# Altium footprint library texas.PCBLIB: 124 footprints (part 10 of 12)
Each footprint in its own frame and in the unit in brackets; x right, y up, seen from the top. Pads: shape width x height; smd on the part's side, far side on the other; paste and mask are expansions set on the pad; w line width, h text height; cw(c..) or ccw(c..) is an arc to the next point about the centre after c.
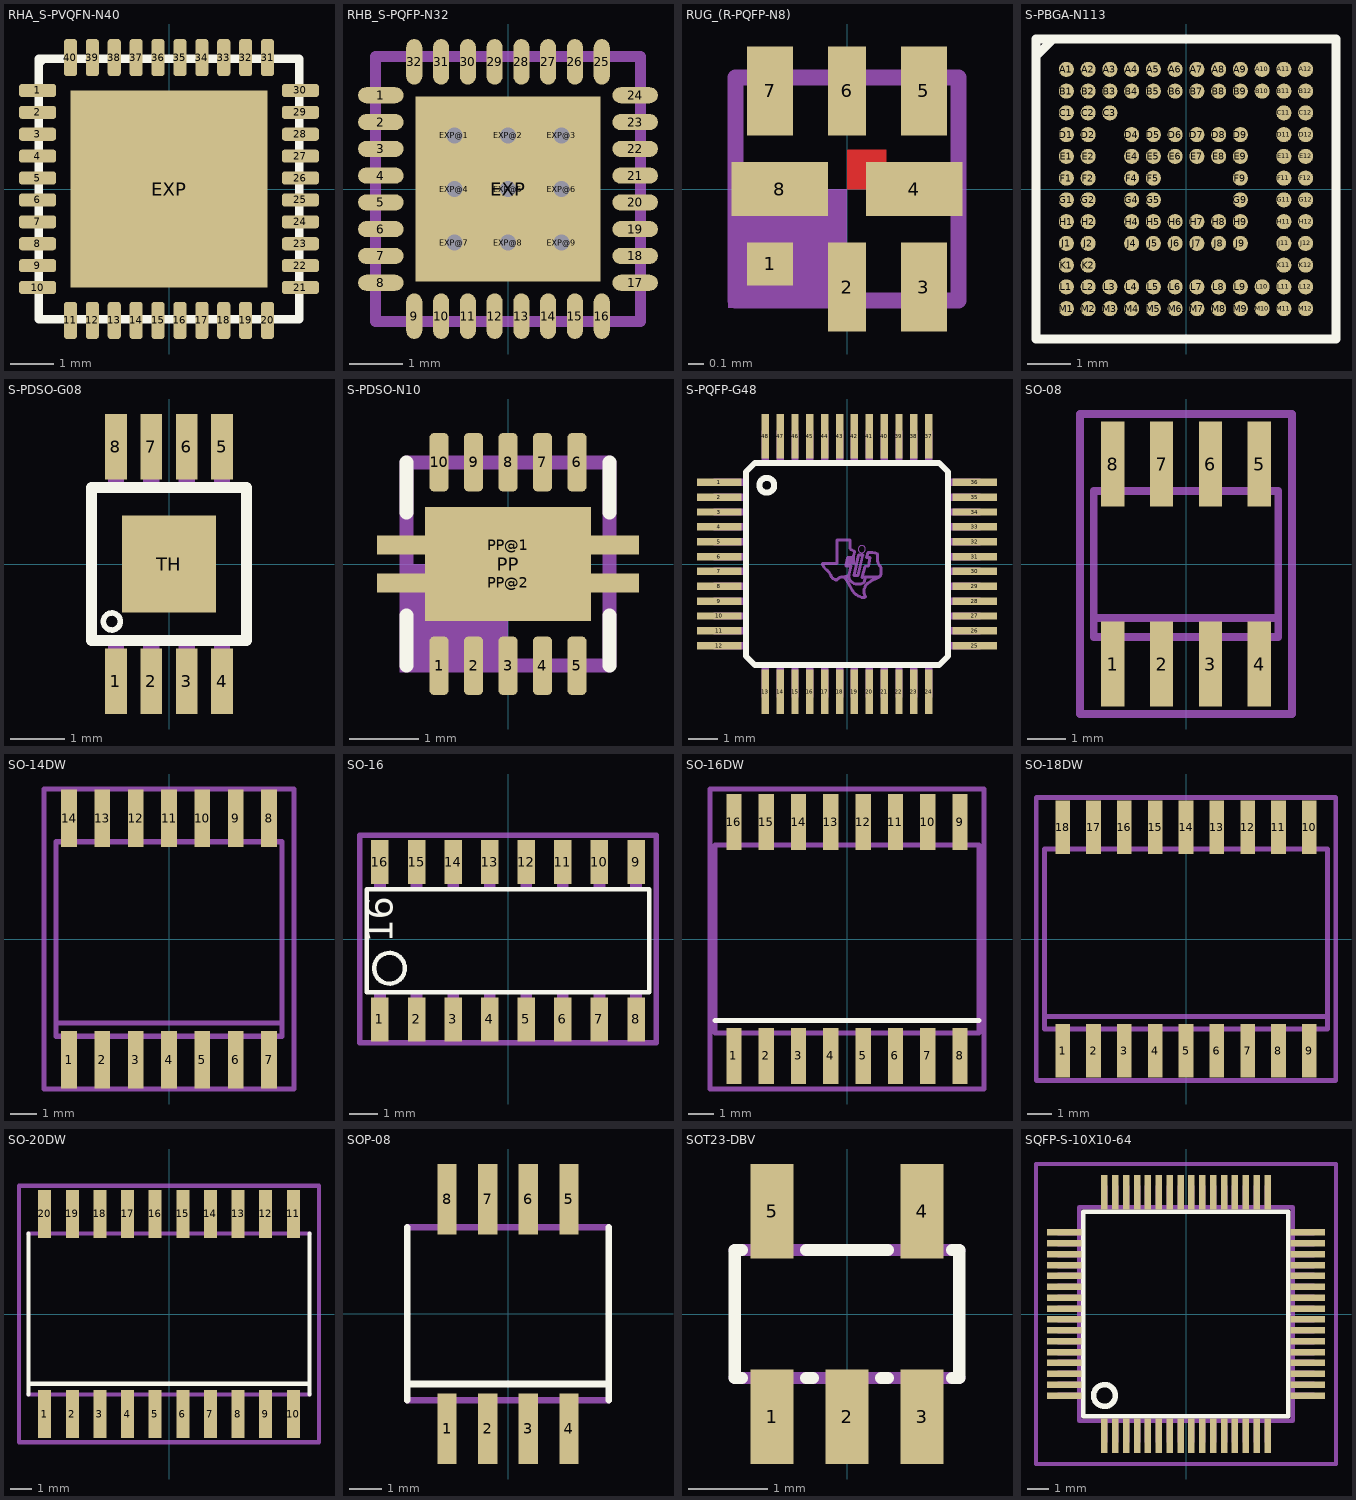
[diagram p9: the footprints below, top view; thin cyan lines are the x and y axes]

## RHA_S-PVQFN-N40 [mm]
pads (41):
  rrect50% 0.85x0.3 smd: 1(-3,2.25) 2(-3,1.75) 3(-3,1.25) 4(-3,0.75) 5(-3,0.25) 6(-3,-0.25) 7(-3,-0.75) 8(-3,-1.25) 9(-3,-1.75) 10(-3,-2.25) 21(3,-2.25) 22(3,-1.75) 23(3,-1.25) 24(3,-0.75) 25(3,-0.25) 26(3,0.25) 27(3,0.75) 28(3,1.25) 29(3,1.75) 30(3,2.25)
  rrect50% 0.3x0.85 smd: 11(-2.25,-3) 12(-1.75,-3) 13(-1.25,-3) 14(-0.75,-3) 15(-0.25,-3) 16(0.25,-3) 17(0.75,-3) 18(1.25,-3) 19(1.75,-3) 20(2.25,-3) 31(2.25,3) 32(1.75,3) 33(1.25,3) 34(0.75,3) 35(0.25,3) 36(-0.25,3) 37(-0.75,3) 38(-1.25,3) 39(-1.75,3) 40(-2.25,3)
  rect 4.5x4.5 smd: EXP(0,0)
Top Overlay:
  lines w0.203: -2.973,2.875 -2.875,2.973 ; -2.973,-2.973 2.973,-2.973 2.973,2.973 -2.973,2.973 -2.973,-2.973
Top Paste:
  circle w0: c-2.725,2.25 r0.125
  circle w0: c-2.725,1.75 r0.125
  circle w0: c-2.725,1.25 r0.125
  circle w0: c-2.725,0.75 r0.125
  circle w0: c-2.725,0.25 r0.125
  circle w0: c-2.725,-0.25 r0.125
  circle w0: c-2.725,-0.75 r0.125
  circle w0: c-2.725,-1.25 r0.125
  circle w0: c-2.725,-1.75 r0.125
  circle w0: c-2.725,-2.25 r0.125
  circle w0: c-2.25,-2.725 r0.125
  circle w0: c-1.75,-2.725 r0.125
  circle w0: c-1.25,-2.725 r0.125
  circle w0: c-0.75,-2.725 r0.125
  circle w0: c-0.25,-2.725 r0.125
  circle w0: c0.25,-2.725 r0.125
  circle w0: c0.75,-2.725 r0.125
  circle w0: c1.25,-2.725 r0.125
  circle w0: c1.75,-2.725 r0.125
  circle w0: c2.25,-2.725 r0.125
  circle w0: c2.725,-2.25 r0.125
  circle w0: c2.725,-1.75 r0.125
  circle w0: c2.725,-1.25 r0.125
  circle w0: c2.725,-0.75 r0.125
  circle w0: c2.725,-0.25 r0.125
  circle w0: c2.725,0.25 r0.125
  circle w0: c2.725,0.75 r0.125
  circle w0: c2.725,1.25 r0.125
  circle w0: c2.725,1.75 r0.125
  circle w0: c2.725,2.25 r0.125
  circle w0: c2.25,2.725 r0.125
  circle w0: c1.75,2.725 r0.125
  circle w0: c1.25,2.725 r0.125
  circle w0: c0.75,2.725 r0.125
  circle w0: c0.25,2.725 r0.125
  circle w0: c-0.25,2.725 r0.125
  circle w0: c-0.75,2.725 r0.125
  circle w0: c-1.25,2.725 r0.125
  circle w0: c-1.75,2.725 r0.125
  circle w0: c-2.25,2.725 r0.125
  rectangle: -3.375,2.125 -2.725,2.375
  rectangle: -3.375,1.625 -2.725,1.875
  rectangle: -3.375,1.125 -2.725,1.375
  rectangle: -3.375,0.625 -2.725,0.875
  rectangle: -3.375,0.125 -2.725,0.375
  rectangle: -3.375,-0.375 -2.725,-0.125
  rectangle: -3.375,-0.875 -2.725,-0.625
  rectangle: -3.375,-1.375 -2.725,-1.125
  rectangle: -3.375,-1.875 -2.725,-1.625
  rectangle: -3.375,-2.375 -2.725,-2.125
  region: -2.125,-3.375 -2.125,-2.725 -2.375,-2.725 -2.375,-3.375
  region: -1.625,-3.375 -1.625,-2.725 -1.875,-2.725 -1.875,-3.375
  region: -1.125,-3.375 -1.125,-2.725 -1.375,-2.725 -1.375,-3.375
  region: -0.625,-3.375 -0.625,-2.725 -0.875,-2.725 -0.875,-3.375
  region: -0.125,-3.375 -0.125,-2.725 -0.375,-2.725 -0.375,-3.375
  region: 0.375,-3.375 0.375,-2.725 0.125,-2.725 0.125,-3.375
  region: 0.875,-3.375 0.875,-2.725 0.625,-2.725 0.625,-3.375
  region: 1.375,-3.375 1.375,-2.725 1.125,-2.725 1.125,-3.375
  region: 1.875,-3.375 1.875,-2.725 1.625,-2.725 1.625,-3.375
  region: 2.375,-3.375 2.375,-2.725 2.125,-2.725 2.125,-3.375
  region: 3.375,-2.125 2.725,-2.125 2.725,-2.375 3.375,-2.375
  region: 3.375,-1.625 2.725,-1.625 2.725,-1.875 3.375,-1.875
  region: 3.375,-1.125 2.725,-1.125 2.725,-1.375 3.375,-1.375
  region: 3.375,-0.625 2.725,-0.625 2.725,-0.875 3.375,-0.875
  region: 3.375,-0.125 2.725,-0.125 2.725,-0.375 3.375,-0.375
  region: 3.375,0.375 2.725,0.375 2.725,0.125 3.375,0.125
  region: 3.375,0.875 2.725,0.875 2.725,0.625 3.375,0.625
  region: 3.375,1.375 2.725,1.375 2.725,1.125 3.375,1.125
  region: 3.375,1.875 2.725,1.875 2.725,1.625 3.375,1.625
  region: 3.375,2.375 2.725,2.375 2.725,2.125 3.375,2.125
  region: 2.125,3.375 2.125,2.725 2.375,2.725 2.375,3.375
  region: 1.625,3.375 1.625,2.725 1.875,2.725 1.875,3.375
  region: 1.125,3.375 1.125,2.725 1.375,2.725 1.375,3.375
  region: 0.625,3.375 0.625,2.725 0.875,2.725 0.875,3.375
  region: 0.125,3.375 0.125,2.725 0.375,2.725 0.375,3.375
  region: -0.375,3.375 -0.375,2.725 -0.125,2.725 -0.125,3.375
  region: -0.875,3.375 -0.875,2.725 -0.625,2.725 -0.625,3.375
  region: -1.375,3.375 -1.375,2.725 -1.125,2.725 -1.125,3.375
  region: -1.875,3.375 -1.875,2.725 -1.625,2.725 -1.625,3.375
  region: -2.375,3.375 -2.375,2.725 -2.125,2.725 -2.125,3.375
  rectangle: -1.95,0.75 -0.75,1.95
  rectangle: -0.6,-0.6 0.6,0.6
  rectangle: -1.95,-0.6 -0.75,0.6
  rectangle: 0.75,-0.6 1.95,0.6
  rectangle: -0.6,0.75 0.6,1.95
  rectangle: 0.75,0.75 1.95,1.95
  rectangle: -1.95,-1.95 -0.75,-0.75
  rectangle: -0.6,-1.95 0.6,-0.75
  rectangle: 0.75,-1.95 1.95,-0.75
Top Solder:
  drawing of 41 lines, arcs and shapes, not listed
Mechanical 16:
  rectangle: -3.4,2.135 -3.075,2.365
  rectangle: -3.4,1.635 -3.075,1.865
  rectangle: -3.4,1.135 -3.075,1.365
  rectangle: -3.4,0.635 -3.075,0.865
  rectangle: -3.4,0.135 -3.075,0.365
  rectangle: -3.4,-0.365 -3.075,-0.135
  rectangle: -3.4,-0.865 -3.075,-0.635
  rectangle: -3.4,-1.365 -3.075,-1.135
  rectangle: -3.4,-1.865 -3.075,-1.635
  rectangle: -3.4,-2.365 -3.075,-2.135
  rectangle: -2.365,-3.4 -2.135,-3.075
  rectangle: -1.865,-3.4 -1.635,-3.075
  rectangle: -1.365,-3.4 -1.135,-3.075
  rectangle: -0.865,-3.4 -0.635,-3.075
  rectangle: -0.365,-3.4 -0.135,-3.075
  rectangle: 0.135,-3.4 0.365,-3.075
  rectangle: 0.635,-3.4 0.865,-3.075
  rectangle: 1.135,-3.4 1.365,-3.075
  rectangle: 1.635,-3.4 1.865,-3.075
  rectangle: 2.135,-3.4 2.365,-3.075
  rectangle: 3.075,-2.365 3.4,-2.135
  rectangle: 3.075,-1.865 3.4,-1.635
  rectangle: 3.075,-1.365 3.4,-1.135
  rectangle: 3.075,-0.865 3.4,-0.635
  rectangle: 3.075,-0.365 3.4,-0.135
  rectangle: 3.075,0.135 3.4,0.365
  rectangle: 3.075,0.635 3.4,0.865
  rectangle: 3.075,1.135 3.4,1.365
  rectangle: 3.075,1.635 3.4,1.865
  rectangle: 3.075,2.135 3.4,2.365
  rectangle: 2.135,3.075 2.365,3.4
  rectangle: 1.635,3.075 1.865,3.4
  rectangle: 1.135,3.075 1.365,3.4
  rectangle: 0.635,3.075 0.865,3.4
  rectangle: 0.135,3.075 0.365,3.4
  rectangle: -0.365,3.075 -0.135,3.4
  rectangle: -0.865,3.075 -0.635,3.4
  rectangle: -1.365,3.075 -1.135,3.4
  rectangle: -1.865,3.075 -1.635,3.4
  rectangle: -2.365,3.075 -2.135,3.4

## RHB_S-PQFP-N32 [mil]
pads (42):
  rrect100% 33.46x11.81 smd: 1(-93.5,68.9) 2(-93.5,49.21) 3(-93.5,29.53) 4(-93.5,9.84) 5(-93.5,-9.84) 6(-93.5,-29.53) 7(-93.5,-49.21) 8(-93.5,-68.9) 17(93.5,-68.9) 18(93.5,-49.21) 19(93.5,-29.53) 20(93.5,-9.84) 21(93.5,9.84) 22(93.5,29.53) 23(93.5,49.21) 24(93.5,68.9)
  rrect100% 11.81x33.46 smd: 9(-68.9,-93.5) 10(-49.21,-93.5) 11(-29.53,-93.5) 12(-9.84,-93.5) 13(9.84,-93.5) 14(29.53,-93.5) 15(49.21,-93.5) 16(68.9,-93.5) 25(68.9,93.5) 26(49.21,93.5) 27(29.53,93.5) 28(9.84,93.5) 29(-9.84,93.5) 30(-29.53,93.5) 31(-49.21,93.5) 32(-68.9,93.5)
  rect 135.83x135.83 smd: EXP(0,0)
  round 23.62 hole 11.81: EXP@1(-39.37,39.37) EXP@2(0,39.37) EXP@3(39.37,39.37) EXP@4(-39.37,0) EXP@5(0,0) EXP@6(39.37,0) EXP@7(-39.37,-39.37) EXP@8(0,-39.37) EXP@9(39.37,-39.37)
Top Paste:
  rectangle: -62.99,5.91 -5.91,62.99
  region: -5.91,-62.99 -5.91,-5.91 -62.99,-5.91 -62.99,-62.99
  region: 62.99,-5.91 5.91,-5.91 5.91,-62.99 62.99,-62.99
  region: 5.91,62.99 5.91,5.91 62.99,5.91 62.99,62.99
  lines w11.02: -104.33,-68.9 -82.68,-68.9 ; -104.33,-49.21 -82.68,-49.21 ; -104.33,-29.53 -82.68,-29.53 ; -104.33,-9.84 -82.68,-9.84 ; -104.33,9.84 -82.68,9.84 ; -104.33,29.53 -82.68,29.53 ; -104.33,49.21 -82.68,49.21 ; -104.33,68.9 -82.68,68.9 ; -68.9,-104.33 -68.9,-82.68 ; -68.9,82.68 -68.9,104.33 ; -49.21,-104.33 -49.21,-82.68 ; -49.21,82.68 -49.21,104.33 ; -29.53,-104.33 -29.53,-82.68 ; -29.53,82.68 -29.53,104.33 ; -9.84,-104.33 -9.84,-82.68 ; -9.84,82.68 -9.84,104.33 ; 9.84,-104.33 9.84,-82.68 ; 9.84,82.68 9.84,104.33 ; 29.53,-104.33 29.53,-82.68 ; 29.53,82.68 29.53,104.33 ; 49.21,-104.33 49.21,-82.68 ; 49.21,82.68 49.21,104.33 ; 68.9,-104.33 68.9,-82.68 ; 68.9,82.68 68.9,104.33 ; 82.68,-68.9 104.33,-68.9 ; 82.68,-49.21 104.33,-49.21 ; 82.68,-29.53 104.33,-29.53 ; 82.68,-9.84 104.33,-9.84 ; 82.68,9.84 104.33,9.84 ; 82.68,29.53 104.33,29.53 ; 82.68,49.21 104.33,49.21 ; 82.68,68.9 104.33,68.9
Top Solder:
  rectangle: -68.9,-68.9 68.9,68.9
  lines w13.78: -104.33,-68.9 -82.68,-68.9 ; -104.33,-49.21 -82.68,-49.21 ; -104.33,-29.53 -82.68,-29.53 ; -104.33,-9.84 -82.68,-9.84 ; -104.33,9.84 -82.68,9.84 ; -104.33,29.53 -82.68,29.53 ; -104.33,49.21 -82.68,49.21 ; -104.33,68.9 -82.68,68.9 ; -68.9,-104.33 -68.9,-82.68 ; -68.9,82.68 -68.9,104.33 ; -49.21,-104.33 -49.21,-82.68 ; -49.21,82.68 -49.21,104.33 ; -29.53,-104.33 -29.53,-82.68 ; -29.53,82.68 -29.53,104.33 ; -9.84,-104.33 -9.84,-82.68 ; -9.84,82.68 -9.84,104.33 ; 9.84,-104.33 9.84,-82.68 ; 9.84,82.68 9.84,104.33 ; 29.53,-104.33 29.53,-82.68 ; 29.53,82.68 29.53,104.33 ; 49.21,-104.33 49.21,-82.68 ; 49.21,82.68 49.21,104.33 ; 68.9,-104.33 68.9,-82.68 ; 68.9,82.68 68.9,104.33 ; 82.68,-68.9 104.33,-68.9 ; 82.68,-49.21 104.33,-49.21 ; 82.68,-29.53 104.33,-29.53 ; 82.68,-9.84 104.33,-9.84 ; 82.68,9.84 104.33,9.84 ; 82.68,29.53 104.33,29.53 ; 82.68,49.21 104.33,49.21 ; 82.68,68.9 104.33,68.9
Mechanical 16:
  lines w8: -97.38,-97.38 97.38,-97.38 97.38,97.38 -97.38,97.38 -97.38,-97.38

## RUG_(R-PQFP-N8) [mm]
pads (8):
  rect 0.3x0.28 smd: 1(-0.5,-0.487)
  rect 0.25x0.58 smd: 2(0,-0.638) 6(0,0.638)
  rect 0.3x0.58 smd: 3(0.5,-0.638) 5(0.5,0.638) 7(-0.5,0.638)
  rect 0.63x0.35 smd: 4(0.437,0) 8(-0.437,0)
Top Layer:
  region: 0,0 0.254,0 0.254,0.254 0,0.254
Top Paste:
  rectangle: -0.125,-0.913 0.125,-0.362
  rectangle: 0.375,-0.913 0.625,-0.362
  rectangle: 0.15,-0.15 0.725,0.15
  region: 0.125,0.913 -0.125,0.913 -0.125,0.362 0.125,0.362
  region: 0.625,0.913 0.375,0.913 0.375,0.362 0.625,0.362
  region: -0.375,0.913 -0.625,0.913 -0.625,0.362 -0.375,0.362
  region: -0.15,0.15 -0.725,0.15 -0.725,-0.15 -0.15,-0.15
  region: 0,0 0.254,0 0.254,0.254 0,0.254
Top Solder:
  rectangle: -0.7,-0.975 -0.3,-0.3
  rectangle: -0.175,-0.975 0.175,-0.3
  rectangle: 0.3,-0.975 0.688,-0.3
  rectangle: 0.075,-0.225 0.8,0.225
  region: 0.7,0.975 0.3,0.975 0.3,0.3 0.7,0.3
  region: 0.175,0.975 -0.175,0.975 -0.175,0.3 0.175,0.3
  region: -0.3,0.975 -0.7,0.975 -0.7,0.3 -0.3,0.3
  region: -0.075,0.225 -0.8,0.225 -0.8,-0.225 -0.075,-0.225
Mechanical 16:
  rectangle: -0.775,-0.775 0,0
  lines w0.102: -0.725,-0.725 0.725,-0.725 0.725,0.725 -0.725,0.725 -0.725,-0.725

## S-PBGA-N113 [mm]
pads (111):
  rrect100% 0.35x0.35 smd: A1(-2.75,2.75) A2(-2.25,2.75) A3(-1.75,2.75) A4(-1.25,2.75) A5(-0.75,2.75) A6(-0.25,2.75) A7(0.25,2.75) A8(0.75,2.75) A9(1.25,2.75) A10(1.75,2.75) A11(2.25,2.75) A12(2.75,2.75) B1(-2.75,2.25) B2(-2.25,2.25) B3(-1.75,2.25) B4(-1.25,2.25) B5(-0.75,2.25) B6(-0.25,2.25) B7(0.25,2.25) B8(0.75,2.25) B9(1.25,2.25) B10(1.75,2.25) B11(2.25,2.25) B12(2.75,2.25) C1(-2.75,1.75) C2(-2.25,1.75) C3(-1.75,1.75) C11(2.25,1.75) C12(2.75,1.75) D1(-2.75,1.25) D2(-2.25,1.25) D4(-1.25,1.25) D5(-0.75,1.25) D6(-0.25,1.25) D7(0.25,1.25) D8(0.75,1.25) D9(1.25,1.25) D11(2.25,1.25) D12(2.75,1.25) E1(-2.75,0.75) E2(-2.25,0.75) E4(-1.25,0.75) E5(-0.75,0.75) E6(-0.25,0.75) E7(0.25,0.75) E8(0.75,0.75) E9(1.25,0.75) E11(2.25,0.75) E12(2.75,0.75) F1(-2.75,0.25) F2(-2.25,0.25) F4(-1.25,0.25) F5(-0.75,0.25) F9(1.25,0.25) F11(2.25,0.25) F12(2.75,0.25) G1(-2.75,-0.25) G2(-2.25,-0.25) G4(-1.25,-0.25) G5(-0.75,-0.25) G9(1.25,-0.25) G11(2.25,-0.25) G12(2.75,-0.25) H1(-2.75,-0.75) H2(-2.25,-0.75) H4(-1.25,-0.75) H5(-0.75,-0.75) H6(-0.25,-0.75) H7(0.25,-0.75) H8(0.75,-0.75) H9(1.25,-0.75) H11(2.25,-0.75) H12(2.75,-0.75) J1(-2.75,-1.25) J2(-2.25,-1.25) J4(-1.25,-1.25) J5(-0.75,-1.25) J6(-0.25,-1.25) J7(0.25,-1.25) J8(0.75,-1.25) J9(1.25,-1.25) J11(2.25,-1.25) J12(2.75,-1.25) K1(-2.75,-1.75) K2(-2.25,-1.75) K11(2.25,-1.75) K12(2.75,-1.75) L1(-2.75,-2.25) L2(-2.25,-2.25) L3(-1.75,-2.25) L4(-1.25,-2.25) L5(-0.75,-2.25) L6(-0.25,-2.25) L7(0.25,-2.25) L8(0.75,-2.25) L9(1.25,-2.25) L10(1.75,-2.25) L11(2.25,-2.25) L12(2.75,-2.25) M1(-2.75,-2.75) M2(-2.25,-2.75) M3(-1.75,-2.75) M4(-1.25,-2.75) M5(-0.75,-2.75) M6(-0.25,-2.75) M7(0.25,-2.75) M8(0.75,-2.75) M9(1.25,-2.75) M10(1.75,-2.75) M11(2.25,-2.75) M12(2.75,-2.75)
Top Overlay:
  lines w0.203: -3.448,3.05 -3.448,3.448 -3.05,3.448 ; -3.448,3.05 -3.448,-3.448 3.448,-3.448 3.448,3.448 -3.05,3.448 ; -3.448,3.05 -3.05,3.448
Top Solder:
  circle w0: c2.25,-2.75 r0.175
  circle w0: c1.75,-2.75 r0.175
  circle w0: c1.25,-2.75 r0.175
  circle w0: c0.75,-2.75 r0.175
  circle w0: c0.25,-2.75 r0.175
  circle w0: c-0.25,-2.75 r0.175
  circle w0: c-0.75,-2.75 r0.175
  circle w0: c-1.25,-2.75 r0.175
  circle w0: c-1.75,-2.75 r0.175
  circle w0: c-2.25,-2.75 r0.175
  circle w0: c2.75,-2.25 r0.175
  circle w0: c1.75,-2.25 r0.175
  circle w0: c1.25,-2.25 r0.175
  circle w0: c0.75,-2.25 r0.175
  circle w0: c0.25,-2.25 r0.175
  circle w0: c-0.25,-2.25 r0.175
  circle w0: c-0.75,-2.25 r0.175
  circle w0: c-1.25,-2.25 r0.175
  circle w0: c-1.75,-2.25 r0.175
  circle w0: c-2.75,-2.25 r0.175
  circle w0: c2.75,-1.75 r0.175
  circle w0: c2.25,-1.75 r0.175
  circle w0: c-2.25,-1.75 r0.175
  circle w0: c-2.75,-1.75 r0.175
  circle w0: c2.75,-1.25 r0.175
  circle w0: c2.25,-1.25 r0.175
  circle w0: c0.75,-1.25 r0.175
  circle w0: c0.25,-1.25 r0.175
  circle w0: c-0.25,-1.25 r0.175
  circle w0: c-0.75,-1.25 r0.175
  circle w0: c-2.25,-1.25 r0.175
  circle w0: c-2.75,-1.25 r0.175
  circle w0: c2.75,-0.75 r0.175
  circle w0: c2.25,-0.75 r0.175
  circle w0: c1.25,-0.75 r0.175
  circle w0: c0.25,-0.75 r0.175
  circle w0: c-0.25,-0.75 r0.175
  circle w0: c-0.75,-0.75 r0.175
  circle w0: c-1.25,-0.75 r0.175
  circle w0: c-2.25,-0.75 r0.175
  circle w0: c-2.75,-0.75 r0.175
  circle w0: c2.75,-0.25 r0.175
  circle w0: c2.25,-0.25 r0.175
  circle w0: c1.25,-0.25 r0.175
  circle w0: c-0.75,-0.25 r0.175
  circle w0: c-1.25,-0.25 r0.175
  circle w0: c-2.25,-0.25 r0.175
  circle w0: c-2.75,-0.25 r0.175
  circle w0: c2.75,0.25 r0.175
  circle w0: c2.25,0.25 r0.175
  circle w0: c1.25,0.25 r0.175
  circle w0: c-0.75,0.25 r0.175
  circle w0: c-1.25,0.25 r0.175
  circle w0: c-2.25,0.25 r0.175
  circle w0: c-2.75,0.25 r0.175
  circle w0: c2.75,0.75 r0.175
  circle w0: c2.25,0.75 r0.175
  circle w0: c1.25,0.75 r0.175
  circle w0: c0.75,0.75 r0.175
  circle w0: c0.25,0.75 r0.175
  circle w0: c-0.25,0.75 r0.175
  circle w0: c-0.75,0.75 r0.175
  circle w0: c-1.25,0.75 r0.175
  circle w0: c-2.25,0.75 r0.175
  circle w0: c-2.75,0.75 r0.175
  circle w0: c2.75,1.25 r0.175
  circle w0: c2.25,1.25 r0.175
  circle w0: c0.75,1.25 r0.175
  circle w0: c0.25,1.25 r0.175
  circle w0: c-0.25,1.25 r0.175
  circle w0: c-0.75,1.25 r0.175
  circle w0: c-2.25,1.25 r0.175
  circle w0: c-2.75,1.25 r0.175
  circle w0: c2.75,1.75 r0.175
  circle w0: c2.25,1.75 r0.175
  circle w0: c-1.75,1.75 r0.175
  circle w0: c-2.25,1.75 r0.175
  circle w0: c-2.75,1.75 r0.175
  circle w0: c2.75,2.25 r0.175
  circle w0: c1.75,2.25 r0.175
  circle w0: c1.25,2.25 r0.175
  circle w0: c0.75,2.25 r0.175
  circle w0: c0.25,2.25 r0.175
  circle w0: c-0.25,2.25 r0.175
  circle w0: c-0.75,2.25 r0.175
  circle w0: c-1.25,2.25 r0.175
  circle w0: c-1.75,2.25 r0.175
  circle w0: c-2.25,2.25 r0.175
  circle w0: c-2.75,2.25 r0.175
  circle w0: c2.25,2.75 r0.175
  circle w0: c1.75,2.75 r0.175
  circle w0: c1.25,2.75 r0.175
  circle w0: c0.75,2.75 r0.175
  circle w0: c0.25,2.75 r0.175
  circle w0: c-0.25,2.75 r0.175
  circle w0: c-0.75,2.75 r0.175
  circle w0: c-1.25,2.75 r0.175
  circle w0: c-1.75,2.75 r0.175
  circle w0: c-2.25,2.75 r0.175
  circle w0: c-2.75,2.75 r0.175
  circle w0: c-2.75,-2.75 r0.175
  circle w0: c-2.25,-2.25 r0.175
  circle w0: c2.75,-2.75 r0.175
  circle w0: c2.25,-2.25 r0.175
  circle w0: c2.25,2.25 r0.175
  circle w0: c2.75,2.75 r0.175
  circle w0: c-1.25,1.25 r0.175
  circle w0: c1.25,1.25 r0.175
  circle w0: c-1.25,-1.25 r0.175
  circle w0: c1.25,-1.25 r0.175
  circle w0: c0.75,-0.75 r0.175

## S-PDSO-G08 [mm]
pads (9):
  rect 0.4x1.2 smd: 1(-0.975,-2.157) 2(-0.325,-2.157) 3(0.325,-2.157) 4(0.975,-2.157) 5(0.975,2.157) 6(0.325,2.157) 7(-0.325,2.157) 8(-0.975,2.157)
  rect 1.73x1.78 smd: TH(0,0)
Top Overlay:
  circle w0.102: c-1.05,-1.057 r0.157
  lines w0.203: -1.425,-1.407 1.425,-1.407 1.425,1.407 -1.425,1.407 -1.425,-1.407
Top Paste:
  rectangle: -0.825,-0.85 0.825,0.85
Top Solder:
  rectangle: -0.85,-0.875 0.85,0.875
Mechanical 16:
  rectangle: -1.125,-2.5 -0.825,-1.487
  rectangle: -0.475,-2.5 -0.175,-1.487
  rectangle: 0.175,-2.5 0.475,-1.487
  rectangle: 0.825,-2.5 1.125,-1.487
  region: 1.125,2.5 0.825,2.5 0.825,1.487 1.125,1.487
  region: 0.475,2.5 0.175,2.5 0.175,1.487 0.475,1.487
  region: -0.175,2.5 -0.475,2.5 -0.475,1.487 -0.175,1.487
  region: -0.825,2.5 -1.125,2.5 -1.125,1.487 -0.825,1.487

## S-PDSO-N10 [mm]
pads (13):
  rrect50% 0.28x0.85 smd: 1(-1,-1.475) 2(-0.5,-1.475) 3(0,-1.475) 4(0.5,-1.475) 5(1,-1.475) 6(1,1.475) 7(0.5,1.475) 8(0,1.475) 9(-0.5,1.475) 10(-1,1.475)
  rect 2.4x1.65 smd: PP(0,0)
  rect 3.8x0.28 smd: PP@1(0,0.275) PP@2(0,-0.275)
Top Overlay:
  lines w0.203: -1.475,-1.475 -1.475,-0.748 ; -1.475,0.748 -1.475,1.475 ; 1.475,-1.475 1.475,-0.748 ; 1.475,0.748 1.475,1.475
Top Paste:
  circle w0: c-1,-1.165 r0.115
  circle w0: c-0.5,-1.165 r0.115
  circle w0: c0,-1.165 r0.115
  circle w0: c0.5,-1.165 r0.115
  circle w0: c1,-1.165 r0.115
  circle w0: c1,1.165 r0.115
  circle w0: c0.5,1.165 r0.115
  circle w0: c0,1.165 r0.115
  circle w0: c-0.5,1.165 r0.115
  circle w0: c-1,1.165 r0.115
  rectangle: -1.9,0.15 -1.325,0.4
  rectangle: -1.9,-0.4 -1.325,-0.15
  rectangle: -1.175,0.15 -0.15,0.8
  rectangle: -1.175,-0.8 -0.15,-0.15
  region: 1.175,-0.15 0.15,-0.15 0.15,-0.8 1.175,-0.8
  region: 1.175,0.8 0.15,0.8 0.15,0.15 1.175,0.15
  region: -0.885,-1.85 -0.885,-1.165 -1.115,-1.165 -1.115,-1.85
  region: -0.385,-1.85 -0.385,-1.165 -0.615,-1.165 -0.615,-1.85
  region: 0.115,-1.85 0.115,-1.165 -0.115,-1.165 -0.115,-1.85
  region: 0.615,-1.85 0.615,-1.165 0.385,-1.165 0.385,-1.85
  region: 1.115,-1.85 1.115,-1.165 0.885,-1.165 0.885,-1.85
  region: 0.885,1.85 0.885,1.165 1.115,1.165 1.115,1.85
  region: 0.385,1.85 0.385,1.165 0.615,1.165 0.615,1.85
  region: -0.115,1.85 -0.115,1.165 0.115,1.165 0.115,1.85
  region: -0.615,1.85 -0.615,1.165 -0.385,1.165 -0.385,1.85
  region: -1.115,1.85 -1.115,1.165 -0.885,1.165 -0.885,1.85
  region: 1.9,-0.15 1.325,-0.15 1.325,-0.4 1.9,-0.4
  region: 1.9,0.4 1.325,0.4 1.325,0.15 1.9,0.15
Top Solder:
  circle w0: c-1,-1.165 r0.175
  circle w0: c-0.5,-1.165 r0.175
  circle w0: c0,-1.165 r0.175
  circle w0: c0.5,-1.165 r0.175
  circle w0: c1,-1.165 r0.175
  circle w0: c1,1.165 r0.175
  circle w0: c0.5,1.165 r0.175
  circle w0: c0,1.165 r0.175
  circle w0: c-0.5,1.165 r0.175
  circle w0: c-1,1.165 r0.175
  rectangle: -1.925,0.125 -1.325,0.425
  rectangle: -1.925,-0.425 -1.325,-0.125
  rectangle: -1.225,-0.85 1.225,0.85
  rectangle: -1.175,-1.925 -0.825,-1.165
  rectangle: -0.675,-1.925 -0.325,-1.165
  rectangle: -0.175,-1.925 0.175,-1.165
  rectangle: 0.325,-1.925 0.675,-1.165
  rectangle: 0.825,-1.925 1.175,-1.165
  region: 1.175,1.925 0.825,1.925 0.825,1.165 1.175,1.165
  region: 0.675,1.925 0.325,1.925 0.325,1.165 0.675,1.165
  region: 0.175,1.925 -0.175,1.925 -0.175,1.165 0.175,1.165
  region: -0.325,1.925 -0.675,1.925 -0.675,1.165 -0.325,1.165
  region: -0.825,1.925 -1.175,1.925 -1.175,1.165 -0.825,1.165
  region: 1.925,-0.125 1.325,-0.125 1.325,-0.425 1.925,-0.425
  region: 1.925,0.425 1.325,0.425 1.325,0.125 1.925,0.125
Mechanical 16:
  rectangle: -1.575,-1.575 0,0
  lines w0.203: -1.475,-1.475 1.475,-1.475 1.475,1.475 -1.475,1.475 -1.475,-1.475

## S-PQFP-G48 [mm]
pads (48):
  rect 1.5x0.25 smd: 1(-4.3,2.75) 2(-4.3,2.25) 3(-4.3,1.75) 4(-4.3,1.25) 5(-4.3,0.75) 6(-4.3,0.25) 7(-4.3,-0.25) 8(-4.3,-0.75) 9(-4.3,-1.25) 10(-4.3,-1.75) 11(-4.3,-2.25) 12(-4.3,-2.75) 25(4.3,-2.75) 26(4.3,-2.25) 27(4.3,-1.75) 28(4.3,-1.25) 29(4.3,-0.75) 30(4.3,-0.25) 31(4.3,0.25) 32(4.3,0.75) 33(4.3,1.25) 34(4.3,1.75) 35(4.3,2.25) 36(4.3,2.75)
  rect 0.25x1.5 smd: 13(-2.75,-4.3) 14(-2.25,-4.3) 15(-1.75,-4.3) 16(-1.25,-4.3) 17(-0.75,-4.3) 18(-0.25,-4.3) 19(0.25,-4.3) 20(0.75,-4.3) 21(1.25,-4.3) 22(1.75,-4.3) 23(2.25,-4.3) 24(2.75,-4.3) 37(2.75,4.3) 38(2.25,4.3) 39(1.75,4.3) 40(1.25,4.3) 41(0.75,4.3) 42(0.25,4.3) 43(-0.25,4.3) 44(-0.75,4.3) 45(-1.25,4.3) 46(-1.75,4.3) 47(-2.25,4.3) 48(-2.75,4.3)
Top Overlay:
  circle w0.203: c-2.7,2.65 r0.25
  lines w0.203: -3.4,-3.1 -3.4,3.1 -3.1,3.4 3.1,3.4 3.4,3.1 3.4,-3.1 3.1,-3.4 -3.1,-3.4 -3.4,-3.1
Mechanical 16:
  drawing of 146 lines, arcs and shapes, not listed

## SO-08 [mm]
pads (8):
  rect 0.6x2.2 smd: 1(-1.905,-2.6) 2(-0.635,-2.6) 3(0.635,-2.6) 4(1.905,-2.6) 5(1.905,2.6) 6(0.635,2.6) 7(-0.635,2.6) 8(-1.905,2.6)
Mechanical 16:
  rectangle: -2.15,-3.1 -1.66,-2
  rectangle: -0.88,-3.1 -0.39,-2
  rectangle: 0.39,-3.1 0.88,-2
  rectangle: 1.66,-3.1 2.15,-2
  rectangle: 1.66,2 2.15,3.1
  rectangle: 0.39,2 0.88,3.1
  rectangle: -0.88,2 -0.39,3.1
  rectangle: -2.15,2 -1.66,3.1
  lines w0.203: -2.4,-1.4 -2.4,-1.9 2.4,-1.9 2.4,-1.4 ; -2.4,-1.4 -2.4,1.9 2.4,1.9 2.4,-1.4 ; -2.4,-1.4 2.4,-1.4
Mechanical 27:
  lines w0.2: -2.754,-3.9 2.754,-3.9 2.754,3.9 -2.754,3.9 -2.754,-3.9

## SO-14DW [mm]
pads (14):
  rect 0.6x2.2 smd: 1(-3.81,-4.6) 2(-2.54,-4.6) 3(-1.27,-4.6) 4(0,-4.6) 5(1.27,-4.6) 6(2.54,-4.6) 7(3.81,-4.6) 8(3.81,4.6) 9(2.54,4.6) 10(1.27,4.6) 11(0,4.6) 12(-1.27,4.6) 13(-2.54,4.6) 14(-3.81,4.6)
Mechanical 16:
  rectangle: -4.055,-5.32 -3.565,-3.8
  rectangle: -2.785,-5.32 -2.295,-3.8
  rectangle: -1.515,-5.32 -1.025,-3.8
  rectangle: -0.245,-5.32 0.245,-3.8
  rectangle: 1.025,-5.32 1.515,-3.8
  rectangle: 2.295,-5.32 2.785,-3.8
  rectangle: 3.565,-5.32 4.055,-3.8
  rectangle: 3.565,3.8 4.055,5.32
  rectangle: 2.295,3.8 2.785,5.32
  rectangle: 1.025,3.8 1.515,5.32
  rectangle: -0.245,3.8 0.245,5.32
  rectangle: -1.515,3.8 -1.025,5.32
  rectangle: -2.785,3.8 -2.295,5.32
  rectangle: -4.055,3.8 -3.565,5.32
  lines w0.203: -4.305,-3.2 -4.305,-3.7 4.305,-3.7 4.305,-3.2 ; -4.305,-3.2 -4.305,3.7 4.305,3.7 4.305,-3.2 ; -4.305,-3.2 4.305,-3.2
Mechanical 27:
  lines w0.2: -4.763,-5.715 -4.763,5.715 4.763,5.715 4.763,-5.715 -4.763,-5.715

## SO-16 [mil]
pads (16):
  rect 24x60 smd: 1(-175,-110) 2(-125,-110) 3(-75,-110) 4(-25,-110) 5(25,-110) 6(75,-110) 7(125,-110) 8(175,-110) 9(175,105) 10(125,105) 11(75,105) 12(25,105) 13(-25,105) 14(-75,105) 15(-125,105) 16(-175,105)
Top Overlay:
  circle w6: c-162,-40 r21
  lines w6: -193,-73 193,-73 193,68 -193,68 -193,-73
  text "16" at -145,-5 h62
Mechanical 16:
  rectangle: 167,69 183,109
  rectangle: 117,69 133,109
  rectangle: 67,69 83,109
  rectangle: 17,69 33,109
  rectangle: -33,69 -17,109
  rectangle: -83,69 -67,109
  rectangle: -133,69 -117,109
  rectangle: -183,69 -167,109
  rectangle: -183,-114 -167,-74
  rectangle: -133,-114 -117,-74
  rectangle: -83,-114 -67,-74
  rectangle: -33,-114 -17,-74
  rectangle: 17,-114 33,-74
  rectangle: 67,-114 83,-74
  rectangle: 117,-114 133,-74
  rectangle: 167,-114 183,-74
Mechanical 27:
  lines w7.87: -202.52,-141.77 -202.52,141.77 202.52,141.77 202.52,-141.77 -202.52,-141.77

## SO-16DW [mm]
pads (16):
  rect 0.6x2.2 smd: 1(-4.445,-4.6) 2(-3.175,-4.6) 3(-1.905,-4.6) 4(-0.635,-4.6) 5(0.635,-4.6) 6(1.905,-4.6) 7(3.175,-4.6) 8(4.445,-4.6) 9(4.445,4.6) 10(3.175,4.6) 11(1.905,4.6) 12(0.635,4.6) 13(-0.635,4.6) 14(-1.905,4.6) 15(-3.175,4.6) 16(-4.445,4.6)
Top Overlay:
  lines w0.203: -5.19,-3.2 5.19,-3.2
Mechanical 16:
  rectangle: -4.69,-5.32 -4.2,-3.8
  rectangle: -3.42,-5.32 -2.93,-3.8
  rectangle: -2.15,-5.32 -1.66,-3.8
  rectangle: -0.88,-5.32 -0.39,-3.8
  rectangle: 0.39,-5.32 0.88,-3.8
  rectangle: 1.66,-5.32 2.15,-3.8
  rectangle: 2.93,-5.32 3.42,-3.8
  rectangle: 4.2,-5.32 4.69,-3.8
  rectangle: 4.2,3.8 4.69,5.32
  rectangle: 2.93,3.8 3.42,5.32
  rectangle: 1.66,3.8 2.15,5.32
  rectangle: 0.39,3.8 0.88,5.32
  rectangle: -0.88,3.8 -0.39,5.32
  rectangle: -2.15,3.8 -1.66,5.32
  rectangle: -3.42,3.8 -2.93,5.32
  rectangle: -4.69,3.8 -4.2,5.32
  lines w0.203: -5.19,-3.7 5.19,-3.7 5.19,3.7 -5.19,3.7 -5.19,-3.7
Mechanical 27:
  lines w0.2: -5.395,-5.9 5.395,-5.9 5.395,5.9 -5.395,5.9 -5.395,-5.9

## SO-18DW [mm]
pads (18):
  rect 0.6x2.2 smd: 1(-5.08,-4.6) 2(-3.81,-4.6) 3(-2.54,-4.6) 4(-1.27,-4.6) 5(0,-4.6) 6(1.27,-4.6) 7(2.54,-4.6) 8(3.81,-4.6) 9(5.08,-4.6) 10(5.08,4.6) 11(3.81,4.6) 12(2.54,4.6) 13(1.27,4.6) 14(0,4.6) 15(-1.27,4.6) 16(-2.54,4.6) 17(-3.81,4.6) 18(-5.08,4.6)
Mechanical 16:
  rectangle: -5.325,-5.32 -4.835,-3.8
  rectangle: -4.055,-5.32 -3.565,-3.8
  rectangle: -2.785,-5.32 -2.295,-3.8
  rectangle: -1.515,-5.32 -1.025,-3.8
  rectangle: -0.245,-5.32 0.245,-3.8
  rectangle: 1.025,-5.32 1.515,-3.8
  rectangle: 2.295,-5.32 2.785,-3.8
  rectangle: 3.565,-5.32 4.055,-3.8
  rectangle: 4.835,-5.32 5.325,-3.8
  rectangle: 4.835,3.8 5.325,5.32
  rectangle: 3.565,3.8 4.055,5.32
  rectangle: 2.295,3.8 2.785,5.32
  rectangle: 1.025,3.8 1.515,5.32
  rectangle: -0.245,3.8 0.245,5.32
  rectangle: -1.515,3.8 -1.025,5.32
  rectangle: -2.785,3.8 -2.295,5.32
  rectangle: -4.055,3.8 -3.565,5.32
  rectangle: -5.325,3.8 -4.835,5.32
  lines w0.203: -5.825,-3.2 -5.825,-3.7 5.825,-3.7 5.825,-3.2 ; -5.825,-3.2 -5.825,3.7 5.825,3.7 5.825,-3.2 ; -5.825,-3.2 5.825,-3.2
Mechanical 27:
  lines w0.2: -6.172,-5.829 -6.172,5.829 6.172,5.829 6.172,-5.829 -6.172,-5.829

## SO-20DW [mm]
pads (20):
  rect 0.6x2.2 smd: 1(-5.715,-4.6) 2(-4.445,-4.6) 3(-3.175,-4.6) 4(-1.905,-4.6) 5(-0.635,-4.6) 6(0.635,-4.6) 7(1.905,-4.6) 8(3.175,-4.6) 9(4.445,-4.6) 10(5.715,-4.6) 11(5.715,4.6) 12(4.445,4.6) 13(3.175,4.6) 14(1.905,4.6) 15(0.635,4.6) 16(-0.635,4.6) 17(-1.905,4.6) 18(-3.175,4.6) 19(-4.445,4.6) 20(-5.715,4.6)
Top Overlay:
  lines w0.203: -6.46,-3.7 -6.46,-3.2 ; -6.46,3.7 -6.46,-3.2 ; 6.46,-3.7 6.46,3.7 ; 6.46,-3.2 -6.46,-3.2
Mechanical 16:
  rectangle: -5.96,-5.32 -5.47,-3.8
  rectangle: -4.69,-5.32 -4.2,-3.8
  rectangle: -3.42,-5.32 -2.93,-3.8
  rectangle: -2.15,-5.32 -1.66,-3.8
  rectangle: -0.88,-5.32 -0.39,-3.8
  rectangle: 0.39,-5.32 0.88,-3.8
  rectangle: 1.66,-5.32 2.15,-3.8
  rectangle: 2.93,-5.32 3.42,-3.8
  rectangle: 4.2,-5.32 4.69,-3.8
  rectangle: 5.47,-5.32 5.96,-3.8
  rectangle: 5.47,3.8 5.96,5.32
  rectangle: 4.2,3.8 4.69,5.32
  rectangle: 2.93,3.8 3.42,5.32
  rectangle: 1.66,3.8 2.15,5.32
  rectangle: 0.39,3.8 0.88,5.32
  rectangle: -0.88,3.8 -0.39,5.32
  rectangle: -2.15,3.8 -1.66,5.32
  rectangle: -3.42,3.8 -2.93,5.32
  rectangle: -4.69,3.8 -4.2,5.32
  rectangle: -5.96,3.8 -5.47,5.32
  lines w0.203: -6.46,-3.7 6.46,-3.7 ; -6.46,3.7 6.46,3.7
Mechanical 27:
  lines w0.2: -6.895,-5.9 6.895,-5.9 6.895,5.9 -6.895,5.9 -6.895,-5.9

## SOP-08 [mm]
pads (8):
  rect 0.6x2.2 smd: 1(-1.905,-3.6) 2(-0.635,-3.6) 3(0.635,-3.6) 4(1.905,-3.6) 5(1.905,3.575) 6(0.635,3.575) 7(-0.635,3.575) 8(-1.905,3.575)
Top Overlay:
  lines w0.203: -3.15,-2.7 -3.15,-2.2 ; -3.15,2.7 -3.15,-2.2 ; 3.15,-2.7 3.15,-2.2 ; 3.15,2.7 3.15,-2.2 ; -3.15,-2.2 3.15,-2.2
Mechanical 16:
  rectangle: -2.15,-4.1 -1.66,-2.725
  rectangle: -0.88,-4.1 -0.39,-2.725
  rectangle: 0.39,-4.1 0.88,-2.75
  rectangle: 1.66,-4.1 2.15,-2.725
  rectangle: 1.66,2.7 2.15,4.075
  rectangle: 0.39,2.725 0.88,4.075
  rectangle: -0.88,2.725 -0.39,4.075
  rectangle: -2.15,2.725 -1.66,4.075
  lines w0.203: -3.15,-2.7 3.15,-2.7 ; -3.15,2.7 3.15,2.7

## SOT23-DBV [mm]
pads (5):
  rect 0.55x1.2 smd: 1(-0.95,-1.3) 2(0,-1.3) 3(0.95,-1.3) 4(0.95,1.3) 5(-0.95,1.3)
Top Overlay:
  lines w0.152: -1.328,-0.81 -1.422,-0.81 -1.422,0.81 -1.328,0.81 ; -0.522,-0.81 -0.428,-0.81 ; -0.522,0.81 0.522,0.81 ; 0.428,-0.81 0.522,-0.81 ; 1.328,-0.81 1.422,-0.81 1.422,0.81 1.328,0.81
Mechanical 16:
  rectangle: -1.2,-1.5 -0.7,-0.85
  rectangle: -0.25,-1.5 0.25,-0.85
  rectangle: 0.7,-1.5 1.2,-0.85
  rectangle: 0.7,0.85 1.2,1.5
  rectangle: -1.2,0.85 -0.7,1.5
  lines w0.152: -1.422,-0.81 1.422,-0.81 ; -1.422,0.81 1.422,0.81

## SQFP-S-10X10-64 [mm]
pads (64):
  rect 0.3x1.6 smd: 1(-3.75,-5.6) 2(-3.25,-5.6) 3(-2.75,-5.6) 4(-2.25,-5.6) 5(-1.75,-5.6) 6(-1.25,-5.6) 7(-0.75,-5.6) 8(-0.25,-5.6) 9(0.25,-5.6) 10(0.75,-5.6) 11(1.25,-5.6) 12(1.75,-5.6) 13(2.25,-5.6) 14(2.75,-5.6) 15(3.25,-5.6) 16(3.75,-5.6) 33(3.75,5.6) 34(3.25,5.6) 35(2.75,5.6) 36(2.25,5.6) 37(1.75,5.6) 38(1.25,5.6) 39(0.75,5.6) 40(0.25,5.6) 41(-0.25,5.6) 42(-0.75,5.6) 43(-1.25,5.6) 44(-1.75,5.6) 45(-2.25,5.6) 46(-2.75,5.6) 47(-3.25,5.6) 48(-3.75,5.6)
  rect 1.6x0.3 smd: 17(5.6,-3.75) 18(5.6,-3.25) 19(5.6,-2.75) 20(5.6,-2.25) 21(5.6,-1.75) 22(5.6,-1.25) 23(5.6,-0.75) 24(5.6,-0.25) 25(5.6,0.25) 26(5.6,0.75) 27(5.6,1.25) 28(5.6,1.75) 29(5.6,2.25) 30(5.6,2.75) 31(5.6,3.25) 32(5.6,3.75) 49(-5.6,3.75) 50(-5.6,3.25) 51(-5.6,2.75) 52(-5.6,2.25) 53(-5.6,1.75) 54(-5.6,1.25) 55(-5.6,0.75) 56(-5.6,0.25) 57(-5.6,-0.25) 58(-5.6,-0.75) 59(-5.6,-1.25) 60(-5.6,-1.75) 61(-5.6,-2.25) 62(-5.6,-2.75) 63(-5.6,-3.25) 64(-5.6,-3.75)
Top Overlay:
  circle w0.254: c-3.75,-3.75 r0.5
  lines w0.203: -4.72,-4.71 4.71,-4.71 4.71,4.71 -4.72,4.71 -4.72,-4.71
Mechanical 16:
  rectangle: -3.9,-5.9 -3.6,-4.95
  rectangle: -3.4,-5.9 -3.1,-4.95
  rectangle: -2.9,-5.9 -2.6,-4.95
  rectangle: -2.4,-5.9 -2.1,-4.95
  rectangle: -1.9,-5.9 -1.6,-4.95
  rectangle: -1.4,-5.9 -1.1,-4.95
  rectangle: -0.9,-5.9 -0.6,-4.95
  rectangle: -0.4,-5.9 -0.1,-4.95
  rectangle: 0.1,-5.9 0.4,-4.95
  rectangle: 0.6,-5.9 0.9,-4.95
  rectangle: 1.1,-5.9 1.4,-4.95
  rectangle: 1.6,-5.9 1.9,-4.95
  rectangle: 2.1,-5.9 2.4,-4.95
  rectangle: 2.6,-5.9 2.9,-4.95
  rectangle: 3.1,-5.9 3.4,-4.95
  rectangle: 3.6,-5.9 3.9,-4.95
  rectangle: 4.95,-3.9 5.9,-3.6
  rectangle: 4.95,-3.4 5.9,-3.1
  rectangle: 4.95,-2.9 5.9,-2.6
  rectangle: 4.95,-2.4 5.9,-2.1
  rectangle: 4.95,-1.9 5.9,-1.6
  rectangle: 4.95,-1.4 5.9,-1.1
  rectangle: 4.95,-0.9 5.9,-0.6
  rectangle: 4.95,-0.4 5.9,-0.1
  rectangle: 4.95,0.1 5.9,0.4
  rectangle: 4.95,0.6 5.9,0.9
  rectangle: 4.95,1.1 5.9,1.4
  rectangle: 4.95,1.6 5.9,1.9
  rectangle: 4.95,2.1 5.9,2.4
  rectangle: 4.95,2.6 5.9,2.9
  rectangle: 4.95,3.1 5.9,3.4
  rectangle: 4.95,3.6 5.9,3.9
  rectangle: 3.6,4.95 3.9,5.9
  rectangle: 3.1,4.95 3.4,5.9
  rectangle: 2.6,4.95 2.9,5.9
  rectangle: 2.1,4.95 2.4,5.9
  rectangle: 1.6,4.95 1.9,5.9
  rectangle: 1.1,4.95 1.4,5.9
  rectangle: 0.6,4.95 0.9,5.9
  rectangle: 0.1,4.95 0.4,5.9
  rectangle: -0.4,4.95 -0.1,5.9
  rectangle: -0.9,4.95 -0.6,5.9
  rectangle: -1.4,4.95 -1.1,5.9
  rectangle: -1.9,4.95 -1.6,5.9
  rectangle: -2.4,4.95 -2.1,5.9
  rectangle: -2.9,4.95 -2.6,5.9
  rectangle: -3.4,4.95 -3.1,5.9
  rectangle: -3.9,4.95 -3.6,5.9
  rectangle: -5.9,3.6 -4.95,3.9
  rectangle: -5.9,3.1 -4.95,3.4
  rectangle: -5.9,2.6 -4.95,2.9
  rectangle: -5.9,2.1 -4.95,2.4
  rectangle: -5.9,1.6 -4.95,1.9
  rectangle: -5.9,1.1 -4.95,1.4
  rectangle: -5.9,0.6 -4.95,0.9
  rectangle: -5.9,0.1 -4.95,0.4
  rectangle: -5.9,-0.4 -4.95,-0.1
  rectangle: -5.9,-0.9 -4.95,-0.6
  rectangle: -5.9,-1.4 -4.95,-1.1
  rectangle: -5.9,-1.9 -4.95,-1.6
  rectangle: -5.9,-2.4 -4.95,-2.1
  rectangle: -5.9,-2.9 -4.95,-2.6
  rectangle: -5.9,-3.4 -4.95,-3.1
  rectangle: -5.9,-3.9 -4.95,-3.6
  lines w0.203: -4.91,-4.91 4.91,-4.91 4.91,4.91 -4.91,4.91 -4.91,-4.91
Mechanical 27:
  lines w0.2: -6.9,-6.9 -6.9,6.9 6.9,6.9 6.9,-6.9 -6.9,-6.9